# Altium footprint library WR-FPC_1.00mm.PcbLib: 105 footprints (part 3 of 7)
Each footprint in its own frame and in the unit in brackets; x right, y up, seen from the top. Pads: shape width x height; smd on the part's side, far side on the other; paste and mask are expansions set on the pad; w line width, h text height; cw(c..) or ccw(c..) is an arc to the next point about the centre after c.
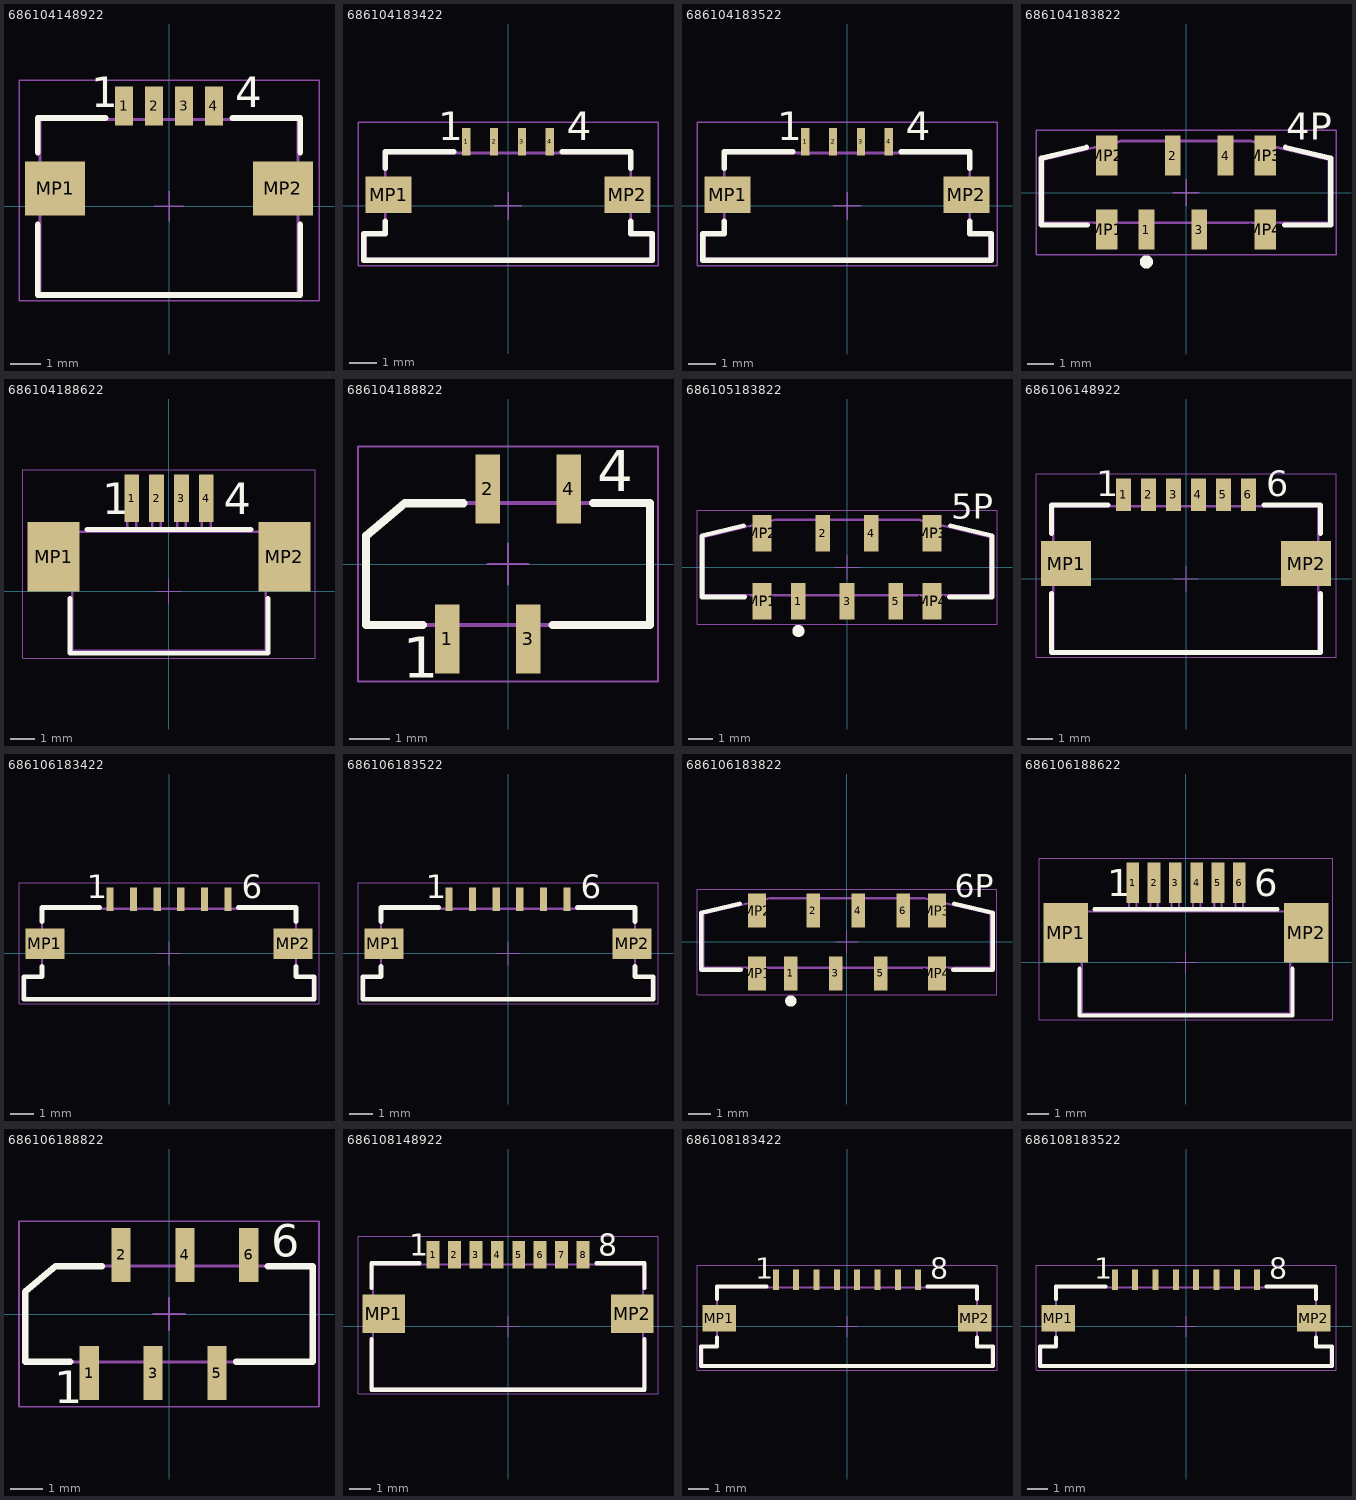
[diagram p2: the footprints below, top view; thin cyan lines are the x and y axes]

## 686104148922 [mm] "ZIF Connectors, Horizontal, Bottom Contact Hinge Type, pitch 1mm, 4p"
height 2.3
pads (6):
  rect 0.6x1.3 smd: 1(-1.5,3.35) 2(-0.5,3.35) 3(0.5,3.35) 4(1.5,3.35)
  rect 2x1.8 smd: MP1(-3.8,0.6) MP2(3.8,0.6)
Top Overlay:
  lines w0.2: -4.375,-0.6 -4.375,-2.95 4.375,-2.95 4.375,-0.6 ; -4.375,1.8 -4.375,2.95 -2.125,2.95 ; 2.125,2.95 4.375,2.95 4.375,1.8
  text "4" at 2.2,3.3 h1.02
  text "1" at -2.6,3.3 h1.02
Mechanical 13:
  lines w0.1: -4.3,-2.9 4.3,-2.9 4.3,2.9 -4.3,2.9 -4.3,-2.9
Mechanical 15:
  lines w0.05: -0.5,0 0.5,0 ; 0,-0.5 0,0.5 ; -5,-3.15 5,-3.15 5,4.2 -5,4.2 -5,-3.15
3D body "686104148922.stp": height 2.27, standoff 0.02, extent -4.3,-2.9 4.3,3.6

## 686104183422 [mm] "ZIF Connectors, Horizontal, Top Contact Low Profile, pitch 1mm, 4p"
height 1.3
pads (6):
  rect 0.3x1 smd: 1(-1.5,2.3) 2(-0.5,2.3) 3(0.5,2.3) 4(1.5,2.3)
  rect 1.65x1.3 smd: MP1(-4.275,0.4) MP2(4.275,0.4)
Top Overlay:
  lines w0.2: -4.4,-0.55 -4.4,-1 -5.175,-1 -5.175,-1.95 5.175,-1.95 5.175,-1 4.4,-1 4.4,-0.55 ; -4.4,1.35 -4.4,1.95 -1.95,1.95 ; 1.95,1.95 4.4,1.95 4.4,1.35
  text "4" at 2.1,2.35 h1.02
  text "1" at -2.5,2.35 h1.02
Mechanical 13:
  lines w0.1: -5.1,-1 -4.4,-1 -4.4,1.9 4.4,1.9 4.4,-1 5.1,-1 5.1,-1.9 -5.1,-1.9 -5.1,-1 ; -5.1,-1 -5.1,-1
Mechanical 15:
  lines w0.05: -0.5,0 0.5,0 ; 0,-0.5 0,0.5 ; -5.375,-2.15 5.375,-2.15 5.375,3 -5.375,3 -5.375,-2.15
3D body "686104183422.stp": height 1.28, standoff -0.01, extent -5.1,-1.9 5.1,2.35

## 686104183522 [mm] "ZIF Connectors, Horizontal, Bottom Contact Low Profile, pitch 1mm, 4p"
height 1.3
pads (6):
  rect 0.3x1 smd: 1(-1.5,2.3) 2(-0.5,2.3) 3(0.5,2.3) 4(1.5,2.3)
  rect 1.65x1.3 smd: MP1(-4.275,0.4) MP2(4.275,0.4)
Top Overlay:
  lines w0.2: -4.4,-0.55 -4.4,-1 -5.175,-1 -5.175,-1.95 5.175,-1.95 5.175,-1 4.4,-1 4.4,-0.55 ; -4.4,1.35 -4.4,1.95 -1.95,1.95 ; 1.95,1.95 4.4,1.95 4.4,1.35
  text "4" at 2.1,2.35 h1.02
  text "1" at -2.5,2.35 h1.02
Mechanical 13:
  lines w0.1: -5.1,-1 -4.4,-1 -4.4,1.9 4.4,1.9 4.4,-1 5.1,-1 5.1,-1.9 -5.1,-1.9 -5.1,-1 ; -5.1,-1 -5.1,-1
Mechanical 15:
  lines w0.05: -0.5,0 0.5,0 ; 0,-0.5 0,0.5 ; -5.375,-2.15 5.375,-2.15 5.375,3 -5.375,3 -5.375,-2.15
3D body "686104183522.stp": height 1.24, standoff -0.01, extent -5.1,-1.9 5.1,2.35

## 686104183822 [mm] "ZIF Connectors, Vertical, Type A, pitch 1mm, 4p"
height 4
pads (8):
  rect 0.6x1.5 smd: 1(-1.5,-1.4) 2(-0.5,1.4) 3(0.5,-1.4) 4(1.5,1.4)
  rect 0.8x1.5 smd: MP1(-3,-1.4) MP2(-3,1.4) MP3(3,1.4) MP4(3,-1.4)
Top Overlay:
  circle w0.25: c-1.5,-2.625 r0.125
  lines w0.2: -3.765,1.708 -5.475,1.297 -5.475,-1.225 -3.725,-1.225 ; 3.725,-1.225 5.475,-1.225 5.475,1.297 3.765,1.708
  text "4P" at 3.8,2 h1.02
Mechanical 13:
  lines w0.1: -5.4,-1.15 -5.4,1.24 -2.45,1.949 2.45,1.95 5.4,1.24 5.4,-1.15 -5.4,-1.15
Mechanical 15:
  lines w0.05: -0.5,0 0.5,0 ; 0,-0.5 0,0.5 ; -5.675,-2.35 -5.675,2.35 5.675,2.35 5.675,-2.35 -5.675,-2.35
3D body "686104183822.stp": height 4, standoff 0, extent -5.4,-1.65 5.4,1.95

## 686104188622 [mm] "LIF Connectors, Horizontal, Top Contact, pitch 1mm, 4p"
height 3.1
pads (6):
  rect 0.6x1.9 smd: 1(-1.5,3.75) 2(-0.5,3.75) 3(0.5,3.75) 4(1.5,3.75)
  rect 2.1x2.8 smd: MP1(-4.65,1.4) MP2(4.65,1.4)
Top Overlay:
  lines w0.2: -4,-0.3 -4,-2.5 4,-2.5 4,-0.3 ; -3.3,2.5 3.3,2.5
  text "4" at 2.2,3.1 h1.27
  text "1" at -2.7,3.1 h1.27
Mechanical 13:
  lines w0.1: -1.675,2.4 -1.675,4.4 -1.325,4.4 -1.325,2.4 ; -0.675,2.4 -0.675,4.4 -0.325,4.4 -0.325,2.4 ; 0.325,2.4 0.325,4.4 0.675,4.4 0.675,2.4 ; 1.325,2.4 1.325,4.4 1.675,4.4 1.675,2.4 ; -5.15,0.4 -3.9,0.4 -3.9,-2.4 3.9,-2.4 3.9,0.4 5.15,0.4 5.15,2.4 -5.15,2.4 -5.15,0.4
Mechanical 15:
  lines w0.05: -0.5,0 0.5,0 ; 0,-0.5 0,0.5 ; -5.9,-2.7 5.9,-2.7 5.9,4.9 -5.9,4.9 -5.9,-2.7
3D body "686104188622.stp": height 3.1, standoff -0.01, extent -5.15,-2.4 5.15,4.4

## 686104188822 [mm] "LIF Connectors, Vertical Type A,  pitch 1mm, 4p"
height 5.1
pads (4):
  rect 0.6x1.7 smd: 1(-1.5,-1.85) 2(-0.5,1.85) 3(0.5,-1.85) 4(1.5,1.85)
Top Overlay:
  lines w0.2: -2.1,-1.5 -3.5,-1.5 -3.5,0.7 -2.547,1.5 -1.1,1.5 ; 1.1,-1.5 3.5,-1.5 3.5,1.5 2.1,1.5
  text "1" at -2.6,-2.8 h1.02
  text "4" at 2.2,1.8 h1.02
Mechanical 13:
  lines w0.1: -2.547,1.5 3.5,1.5 3.5,-1.5 -3.5,-1.5 -3.5,0.7 -2.547,1.5 ; -1.675,-1.5 -1.675,-2.2 -1.325,-2.2 -1.325,-1.5 ; -0.675,1.5 -0.675,2.2 -0.325,2.2 -0.325,1.5 ; 0.325,-1.5 0.325,-2.2 0.675,-2.2 0.675,-1.5 ; 1.325,1.5 1.325,2.2 1.675,2.2 1.675,1.5
Mechanical 15:
  lines w0.05: -0.5,0 0.5,0 ; 0,-0.5 0,0.5 ; -3.7,-2.9 3.7,-2.9 3.7,2.9 -3.7,2.9 -3.7,-2.9
3D body "686104188822.stp": height 5.21, standoff 0.01, extent -3.5,-2.173 3.5,2.227

## 686105183822 [mm] "ZIF Connectors, Vertical, Type A, pitch 1mm, 5p"
height 4
pads (9):
  rect 0.6x1.5 smd: 1(-2,-1.4) 2(-1,1.4) 3(0,-1.4) 4(1,1.4) 5(2,-1.4)
  rect 0.8x1.5 smd: MP1(-3.5,-1.4) MP2(-3.5,1.4) MP3(3.5,1.4) MP4(3.5,-1.4)
Top Overlay:
  circle w0.25: c-2,-2.625 r0.125
  lines w0.2: -4.265,1.708 -5.975,1.297 -5.975,-1.225 -4.225,-1.225 ; 4.225,-1.225 5.975,-1.225 5.975,1.297 4.265,1.708
  text "5P" at 4.3,2 h1.02
Mechanical 13:
  lines w0.1: -5.9,-1.15 -5.9,1.24 -2.95,1.949 2.95,1.95 5.9,1.24 5.9,-1.15 -5.9,-1.15
Mechanical 15:
  lines w0.05: -0.5,0 0.5,0 ; 0,-0.5 0,0.5 ; -6.175,-2.35 -6.175,2.35 6.175,2.35 6.175,-2.35 -6.175,-2.35
3D body "686105183822.stp": height 4, standoff -0.02, extent -5.9,-1.65 5.9,1.95

## 686106148922 [mm] "ZIF Connectors, Horizontal, Bottom Contact Hinge Type, pitch 1mm, 6p"
height 2.3
pads (8):
  rect 0.6x1.3 smd: 1(-2.5,3.35) 2(-1.5,3.35) 3(-0.5,3.35) 4(0.5,3.35) 5(1.5,3.35) 6(2.5,3.35)
  rect 2x1.8 smd: MP1(-4.8,0.6) MP2(4.8,0.6)
Top Overlay:
  lines w0.2: -5.375,-0.6 -5.375,-2.95 5.375,-2.95 5.375,-0.6 ; -5.375,1.8 -5.375,2.95 -3.125,2.95 ; 3.125,2.95 5.375,2.95 5.375,1.8
  text "6" at 3.2,3.3 h1.02
  text "1" at -3.6,3.3 h1.02
Mechanical 13:
  lines w0.1: -5.3,-2.9 5.3,-2.9 5.3,2.9 -5.3,2.9 -5.3,-2.9
Mechanical 15:
  lines w0.05: -0.5,0 0.5,0 ; 0,-0.5 0,0.5 ; -6,-3.15 6,-3.15 6,4.2 -6,4.2 -6,-3.15
3D body "686106148922.stp": height 2.27, standoff 0.02, extent -5.3,-2.9 5.3,3.6

## 686106183422 [mm] "ZIF Connectors, Horizontal, Top Contact Low Profile, pitch 1mm, 6p"
height 1.3
pads (8):
  rect 0.3x1 smd: 1(-2.5,2.3) 2(-1.5,2.3) 3(-0.5,2.3) 4(0.5,2.3) 5(1.5,2.3) 6(2.5,2.3)
  rect 1.65x1.3 smd: MP1(-5.275,0.4) MP2(5.275,0.4)
Top Overlay:
  lines w0.2: -5.4,-0.55 -5.4,-1 -6.175,-1 -6.175,-1.95 6.175,-1.95 6.175,-1 5.4,-1 5.4,-0.55 ; -5.4,1.35 -5.4,1.95 -2.95,1.95 ; 2.95,1.95 5.4,1.95 5.4,1.35
  text "6" at 3.1,2.35 h1.02
  text "1" at -3.5,2.35 h1.02
Mechanical 13:
  lines w0.1: -6.1,-1 -6.1,-1.9 6.1,-1.9 6.1,-1 5.4,-1 5.4,1.9 -5.4,1.9 -5.4,-1 -6.1,-1 ; -6.1,-1 -6.1,-1
Mechanical 15:
  lines w0.05: -0.5,0 0.5,0 ; 0,-0.5 0,0.5 ; -6.375,-2.15 -6.375,3 6.375,3 6.375,-2.15 -6.375,-2.15
3D body "686106183422.stp": height 1.28, standoff -0.01, extent -6.1,-1.9 6.1,2.35

## 686106183522 [mm] "ZIF Connectors, Horizontal, Bottom Contact Low Profile, pitch 1mm, 6p"
height 1.3
pads (8):
  rect 0.3x1 smd: 1(-2.5,2.3) 2(-1.5,2.3) 3(-0.5,2.3) 4(0.5,2.3) 5(1.5,2.3) 6(2.5,2.3)
  rect 1.65x1.3 smd: MP1(-5.275,0.4) MP2(5.275,0.4)
Top Overlay:
  lines w0.2: -5.4,-0.55 -5.4,-1 -6.175,-1 -6.175,-1.95 6.175,-1.95 6.175,-1 5.4,-1 5.4,-0.55 ; -5.4,1.35 -5.4,1.95 -2.95,1.95 ; 2.95,1.95 5.4,1.95 5.4,1.35
  text "6" at 3.1,2.35 h1.02
  text "1" at -3.5,2.35 h1.02
Mechanical 13:
  lines w0.1: -6.1,-1 -6.1,-1.9 6.1,-1.9 6.1,-1 5.4,-1 5.4,1.9 -5.4,1.9 -5.4,-1 -6.1,-1 ; -6.1,-1 -6.1,-1
Mechanical 15:
  lines w0.05: -0.5,0 0.5,0 ; 0,-0.5 0,0.5 ; -6.375,-2.15 -6.375,3 6.375,3 6.375,-2.15 -6.375,-2.15
3D body "686106183522.stp": height 1.24, standoff -0.01, extent -6.1,-1.9 6.1,2.35

## 686106183822 [mm] "ZIF Connectors, Vertical, Type A, pitch 1mm, 6p"
height 4
pads (10):
  rect 0.6x1.5 smd: 1(-2.5,-1.4) 2(-1.5,1.4) 3(-0.5,-1.4) 4(0.5,1.4) 5(1.5,-1.4) 6(2.5,1.4)
  rect 0.8x1.5 smd: MP1(-4,-1.4) MP2(-4,1.4) MP3(4,1.4) MP4(4,-1.4)
Top Overlay:
  circle w0.25: c-2.5,-2.625 r0.125
  lines w0.2: -4.765,1.708 -6.475,1.297 -6.475,-1.225 -4.725,-1.225 ; 4.725,-1.225 6.475,-1.225 6.475,1.297 4.765,1.708
  text "6P" at 4.8,2 h1.02
Mechanical 13:
  lines w0.1: -3.45,1.95 3.45,1.95 6.4,1.24 6.4,-1.15 -6.4,-1.15 -6.4,1.24 -3.45,1.949
Mechanical 15:
  lines w0.05: -0.5,0 0.5,0 ; 0,-0.5 0,0.5 ; -6.675,-2.35 -6.675,2.35 6.675,2.35 6.675,-2.35 -6.675,-2.35
3D body "686106183822.stp": height 4, standoff -0.02, extent -6.4,-1.65 6.4,1.95

## 686106188622 [mm] "LIF Connectors, Horizontal, Top Contact, pitch 1mm, 6p"
height 3.1
pads (8):
  rect 0.6x1.9 smd: 1(-2.5,3.75) 2(-1.5,3.75) 3(-0.5,3.75) 4(0.5,3.75) 5(1.5,3.75) 6(2.5,3.75)
  rect 2.1x2.8 smd: MP1(-5.65,1.4) MP2(5.65,1.4)
Top Overlay:
  lines w0.2: -5,-0.3 -5,-2.5 5,-2.5 5,-0.3 ; -4.3,2.5 4.3,2.5
  text "1" at -3.7,3.1 h1.27
  text "6" at 3.2,3.1 h1.27
Mechanical 13:
  lines w0.1: -2.675,2.4 -2.675,4.4 -2.325,4.4 -2.325,2.4 ; -1.675,2.4 -1.675,4.4 -1.325,4.4 -1.325,2.4 ; -0.675,2.4 -0.675,4.4 -0.325,4.4 -0.325,2.4 ; 0.325,2.4 0.325,4.4 0.675,4.4 0.675,2.4 ; 1.325,2.4 1.325,4.4 1.675,4.4 1.675,2.4 ; 2.325,2.4 2.325,4.4 2.675,4.4 2.675,2.4 ; -6.15,0.4 -6.15,2.4 6.15,2.4 6.15,0.4 4.9,0.4 4.9,-2.4 -4.9,-2.4 -4.9,0.4 -6.15,0.4
Mechanical 15:
  lines w0.05: -0.5,0 0.5,0 ; 0,-0.5 0,0.5 ; -6.9,-2.7 -6.9,4.9 6.9,4.9 6.9,-2.7 -6.9,-2.7
3D body "686106188622.stp": height 3.1, standoff -0.01, extent -6.15,-2.4 6.15,4.4

## 686106188822 [mm] "LIF Connectors, Vertical Type A,  pitch 1mm, 6p"
height 5.1
pads (6):
  rect 0.6x1.7 smd: 1(-2.5,-1.85) 2(-1.5,1.85) 3(-0.5,-1.85) 4(0.5,1.85) 5(1.5,-1.85) 6(2.5,1.85)
Top Overlay:
  lines w0.2: -3.1,-1.5 -4.5,-1.5 -4.5,0.7 -3.547,1.5 -2.1,1.5 ; 2.1,-1.5 4.5,-1.5 4.5,1.5 3.1,1.5
  text "6" at 3.2,1.8 h1.02
  text "1" at -3.6,-2.8 h1.02
Mechanical 13:
  lines w0.1: -2.675,-1.5 -2.675,-2.2 -2.325,-2.2 -2.325,-1.5 ; -1.675,1.5 -1.675,2.2 -1.325,2.2 -1.325,1.5 ; -0.675,-1.5 -0.675,-2.2 -0.325,-2.2 -0.325,-1.5 ; 0.325,1.5 0.325,2.2 0.675,2.2 0.675,1.5 ; 1.325,-1.5 1.325,-2.2 1.675,-2.2 1.675,-1.5 ; 2.325,1.5 2.325,2.2 2.675,2.2 2.675,1.5 ; -4.5,-1.5 4.5,-1.5 4.5,1.5 -3.547,1.5 -4.5,0.7 -4.5,-1.5
Mechanical 15:
  lines w0.05: -0.5,0 0.5,0 ; 0,-0.5 0,0.5 ; -4.7,-2.9 4.7,-2.9 4.7,2.9 -4.7,2.9 -4.7,-2.9
3D body "686106188822.stp": height 5.21, standoff 0.01, extent -4.5,-2.2 4.5,2.2

## 686108148922 [mm] "ZIF Connectors, Horizontal, Bottom Contact Hinge Type, pitch 1mm, 8p"
height 2.3
pads (10):
  rect 0.6x1.3 smd: 1(-3.5,3.35) 2(-2.5,3.35) 3(-1.5,3.35) 4(-0.5,3.35) 5(0.5,3.35) 6(1.5,3.35) 7(2.5,3.35) 8(3.5,3.35)
  rect 2x1.8 smd: MP1(-5.8,0.6) MP2(5.8,0.6)
Top Overlay:
  lines w0.2: -6.375,-0.6 -6.375,-2.95 6.375,-2.95 6.375,-0.6 ; -6.375,1.8 -6.375,2.95 -4.125,2.95 ; 4.125,2.95 6.375,2.95 6.375,1.8
  text "8" at 4.2,3.3 h1.02
  text "1" at -4.6,3.3 h1.02
Mechanical 13:
  lines w0.1: -6.3,-2.9 -6.3,2.9 6.3,2.9 6.3,-2.9 -6.3,-2.9
Mechanical 15:
  lines w0.05: -0.5,0 0.5,0 ; 0,-0.5 0,0.5 ; -7,-3.15 -7,4.2 7,4.2 7,-3.15 -7,-3.15
3D body "686108148922.stp": height 2.27, standoff 0.02, extent -6.3,-2.9 6.3,3.6

## 686108183422 [mm] "ZIF Connectors, Horizontal, Top Contact Low Profile, pitch 1mm, 8p"
height 1.3
pads (10):
  rect 0.3x1 smd: 1(-3.5,2.3) 2(-2.5,2.3) 3(-1.5,2.3) 4(-0.5,2.3) 5(0.5,2.3) 6(1.5,2.3) 7(2.5,2.3) 8(3.5,2.3)
  rect 1.65x1.3 smd: MP1(-6.275,0.4) MP2(6.275,0.4)
Top Overlay:
  lines w0.2: -6.4,-0.55 -6.4,-1 -7.175,-1 -7.175,-1.95 7.175,-1.95 7.175,-1 6.4,-1 6.4,-0.55 ; -6.4,1.35 -6.4,1.95 -3.95,1.95 ; 3.95,1.95 6.4,1.95 6.4,1.35
  text "8" at 4.1,2.35 h1.02
  text "1" at -4.5,2.35 h1.02
Mechanical 13:
  lines w0.1: -7.1,-1 -6.4,-1 -6.4,1.9 6.4,1.9 6.4,-1 7.1,-1 7.1,-1.9 -7.1,-1.9 -7.1,-1 ; -7.1,-1 -7.1,-1
Mechanical 15:
  lines w0.05: -0.5,0 0.5,0 ; 0,-0.5 0,0.5 ; -7.375,-2.15 7.375,-2.15 7.375,3 -7.375,3 -7.375,-2.15
3D body "686108183422.stp": height 1.28, standoff -0.01, extent -7.1,-1.9 7.1,2.35

## 686108183522 [mm] "ZIF Connectors, Horizontal, Bottom Contact Low Profile, pitch 1mm, 8p"
height 1.3
pads (10):
  rect 0.3x1 smd: 1(-3.5,2.3) 2(-2.5,2.3) 3(-1.5,2.3) 4(-0.5,2.3) 5(0.5,2.3) 6(1.5,2.3) 7(2.5,2.3) 8(3.5,2.3)
  rect 1.65x1.3 smd: MP1(-6.275,0.4) MP2(6.275,0.4)
Top Overlay:
  lines w0.2: -6.4,-0.55 -6.4,-1 -7.175,-1 -7.175,-1.95 7.175,-1.95 7.175,-1 6.4,-1 6.4,-0.55 ; -6.4,1.35 -6.4,1.95 -3.95,1.95 ; 3.95,1.95 6.4,1.95 6.4,1.35
  text "8" at 4.1,2.35 h1.02
  text "1" at -4.5,2.35 h1.02
Mechanical 13:
  lines w0.1: -7.1,-1 -7.1,-1.9 7.1,-1.9 7.1,-1 6.4,-1 6.4,1.9 -6.4,1.9 -6.4,-1 -7.1,-1 ; -7.1,-1 -7.1,-1
Mechanical 15:
  lines w0.05: -0.5,0 0.5,0 ; 0,-0.5 0,0.5 ; -7.375,-2.15 -7.375,3 7.375,3 7.375,-2.15 -7.375,-2.15
3D body "686108183522.stp": height 1.24, standoff -0.01, extent -7.1,-1.9 7.1,2.35